# Altium schematic symbol library TI Amplifiers and Linear Operational Amplifier High Speed.SchLib: 1100 symbols (part 11 of 25) (continued)
## THS3001HVIDGN
designator U?
420 MHz Current-Feedback Amplifier, 9 to 32 V, -40 to 85 degC, 8-pin SOP (DGN8), Green (RoHS & no Sb/Br); Manufacturer: Texas Instruments; PartNumber: THS3001HVIDGN; 2nd Harmonic(dBc): 91; 3rd Harmonic(dBc): 86; @ MHz: 5; Acl, min stable gain(V/V): 1; BW @ Acl(MHz): 420; Diff Gain(%): 0.01; Diff Phase(deg): 0.02; Iib(Max)(nA): 15000; Io(Typ)(mA): 120; Iq per channel(Max)(mA): 10; Settling Time (0.1%)(Typ)(ns): 40; Slew Rate(Typ)(V/us): 6500; Sub Family: High Output Current Amplifier (>=50mA), High Speed Amplifier (>=50MHz), High Supply Voltage Amplifier (>=30V); THD (Fc is 1 MHz)(Typ)(dB): -96; Vio(Max)(mV): 3; Vn at Flatband(Typ)(nV/rtHz): 1.6; Vs(Max)(V): 32; Vs(Min)(V): 9; DatasheetVersion: SLOS217H; PackageVersion: 4073271/F, 05/2011; PackageReference: DGN8-1760X1425TP; PackageDescription: 8-pin Plastic Small Outline, Body 3 x 3 mm, Pitch 0.65 mm; Supplier 1: Digi-Key; Supplier Part Number 1: 296-19419-5-ND; Supplier 2: Newark; Supplier Part Number 2: 37K4174; Supplier 3: Mouser; Supplier Part Number 3: 595-THS3001HVIDGN; Eco-Plan: Green (RoHS & no Sb/Br); Number of Channels: 1; Mounting Technology: Surface Mount; Code_JEDEC: MO-187; ComponentLink1Description: Manufacturer URL; ComponentLink1URL: http://www.ti.com/; ComponentLink2Description: Datasheet; ComponentLink2URL: http://www.ti.com/general/docs/lit/getliterature.tsp?genericPartNumber=THS3001&fileType=pdf; ComponentLink3Description: Package Specification; ComponentLink3URL: http://www.ti.com/litv/pdf/mpds046e
footprint TI-DGN8-1760X1425TP_N (SOP, 8-Leads, Body 3x3mm, Pitch 0.65mm, Thermal Pad 1.76x1.425mm, IPC Medium Density)
footprint TI-DGN8-1760X1425TP_L (SOP, 8-Leads, Body 3x3mm, Pitch 0.65mm, Thermal Pad 1.76x1.425mm, IPC High Density)
footprint TI-DGN8-1760X1425TP_M (SOP, 8-Leads, Body 3x3mm, Pitch 0.65mm, Thermal Pad 1.76 x 1.425 mm, IPC Low Density)
part A pins: 2 IN- (in), 3 IN+ (in), 4 VCC- (power), 6 OUT (out), 7 VCC+ (power), 9 EP (power)
part B pins: 1 NC, 5 NC, 8 NC

## THS3001HVIDGNG4
designator U?
420 MHz Current-Feedback Amplifier, 9 to 32 V, -40 to 85 degC, 8-pin SOP (DGN8), Green (RoHS & no Sb/Br); Manufacturer: Texas Instruments; PartNumber: THS3001HVIDGNG4; 2nd Harmonic(dBc): 91; 3rd Harmonic(dBc): 86; @ MHz: 5; Acl, min stable gain(V/V): 1; BW @ Acl(MHz): 420; Diff Gain(%): 0.01; Diff Phase(deg): 0.02; Iib(Max)(nA): 15000; Io(Typ)(mA): 120; Iq per channel(Max)(mA): 10; Settling Time (0.1%)(Typ)(ns): 40; Slew Rate(Typ)(V/us): 6500; Sub Family: High Output Current Amplifier (>=50mA), High Speed Amplifier (>=50MHz), High Supply Voltage Amplifier (>=30V); THD (Fc is 1 MHz)(Typ)(dB): -96; Vio(Max)(mV): 3; Vn at Flatband(Typ)(nV/rtHz): 1.6; Vs(Max)(V): 32; Vs(Min)(V): 9; DatasheetVersion: SLOS217H; PackageVersion: 4073271/F, 05/2011; PackageReference: DGN8-1760X1425TP; PackageDescription: 8-pin Plastic Small Outline, Body 3 x 3 mm, Pitch 0.65 mm; Supplier 1: Digi-Key; Supplier Part Number 1: THS3001HVIDGNG4-ND; Supplier 2: Mouser; Supplier Part Number 2: 595-THS3001HVIDGNG4; Eco-Plan: Green (RoHS & no Sb/Br); Number of Channels: 1; Mounting Technology: Surface Mount; Code_JEDEC: MO-187; ComponentLink1Description: Manufacturer URL; ComponentLink1URL: http://www.ti.com/; ComponentLink2Description: Datasheet; ComponentLink2URL: http://www.ti.com/general/docs/lit/getliterature.tsp?genericPartNumber=THS3001&fileType=pdf; ComponentLink3Description: Package Specification; ComponentLink3URL: http://www.ti.com/litv/pdf/mpds046e
footprint TI-DGN8-1760X1425TP_N (SOP, 8-Leads, Body 3x3mm, Pitch 0.65mm, Thermal Pad 1.76x1.425mm, IPC Medium Density)
footprint TI-DGN8-1760X1425TP_L (SOP, 8-Leads, Body 3x3mm, Pitch 0.65mm, Thermal Pad 1.76x1.425mm, IPC High Density)
footprint TI-DGN8-1760X1425TP_M (SOP, 8-Leads, Body 3x3mm, Pitch 0.65mm, Thermal Pad 1.76 x 1.425 mm, IPC Low Density)
part A pins: 2 IN- (in), 3 IN+ (in), 4 VCC- (power), 6 OUT (out), 7 VCC+ (power), 9 EP (power)
part B pins: 1 NC, 5 NC, 8 NC

## THS3001ID
designator U?
420 MHz Current-Feedback Amplifier, 9 to 32 V, -40 to 85 degC, 8-pin SOIC (D8), Green (RoHS & no Sb/Br); Manufacturer: Texas Instruments; PartNumber: THS3001ID; 2nd Harmonic(dBc): 91; 3rd Harmonic(dBc): 86; @ MHz: 5; Acl, min stable gain(V/V): 1; BW @ Acl(MHz): 420; Diff Gain(%): 0.01; Diff Phase(deg): 0.02; Iib(Max)(nA): 15000; Io(Typ)(mA): 120; Iq per channel(Max)(mA): 10; Settling Time (0.1%)(Typ)(ns): 40; Slew Rate(Typ)(V/us): 6500; Sub Family: High Output Current Amplifier (>=50mA), High Speed Amplifier (>=50MHz), High Supply Voltage Amplifier (>=30V); THD (Fc is 1 MHz)(Typ)(dB): -96; Vio(Max)(mV): 3; Vn at Flatband(Typ)(nV/rtHz): 1.6; Vs(Max)(V): 32; Vs(Min)(V): 9; DatasheetVersion: SLOS217H; PackageVersion: 4040047-3/M, 06/2011; PackageReference: D8; PackageDescription: 8-Pin Plastic Small Outline, Body 4.9 x 3.9 mm, Pitch 1.27 mm; Supplier 1: Digi-Key; Supplier Part Number 1: 296-7507-5-ND; Supplier 2: Farnell; Supplier Part Number 2: 1102959; Supplier 3: Newark; Supplier Part Number 3: 24M8254; Supplier 4: Newark; Supplier Part Number 4: 49H4419; Supplier 5: Mouser; Supplier Part Number 5: 595-THS3001ID; Eco-Plan: Green (RoHS & no Sb/Br); Number of Channels: 1; Mounting Technology: Surface Mount; Code_JEDEC: MS-012; ComponentLink1Description: Manufacturer URL; ComponentLink1URL: http://www.ti.com/; ComponentLink2Description: Datasheet; ComponentLink2URL: http://www.ti.com/general/docs/lit/getliterature.tsp?genericPartNumber=THS3001&fileType=pdf; ComponentLink3Description: Package Specification; ComponentLink3URL: http://www.ti.com/litv/pdf/msoi002j
footprint TI-D8_N (SOIC, 8-Leads, Body 4.9x3.9mm, Pitch 1.27mm, IPC Medium Density)
footprint TI-D8_L (SOIC, 8-Leads, Body 4.9x3.9mm, Pitch 1.27mm, IPC High Density)
footprint TI-D8_M (SOIC, 8-Leads, Body 4.9x3.9mm, Pitch 1.27mm, IPC Low Density)
part A pins: 2 IN- (in), 3 IN+ (in), 4 VCC- (power), 6 OUT (out), 7 VCC+ (power)
part B pins: 1 NC, 5 NC, 8 NC

## THS3001IDG4
designator U?
420 MHz Current-Feedback Amplifier, 9 to 32 V, -40 to 85 degC, 8-pin SOIC (D8), Green (RoHS & no Sb/Br); Manufacturer: Texas Instruments; PartNumber: THS3001IDG4; 2nd Harmonic(dBc): 91; 3rd Harmonic(dBc): 86; @ MHz: 5; Acl, min stable gain(V/V): 1; BW @ Acl(MHz): 420; Diff Gain(%): 0.01; Diff Phase(deg): 0.02; Iib(Max)(nA): 15000; Io(Typ)(mA): 120; Iq per channel(Max)(mA): 10; Settling Time (0.1%)(Typ)(ns): 40; Slew Rate(Typ)(V/us): 6500; Sub Family: High Output Current Amplifier (>=50mA), High Speed Amplifier (>=50MHz), High Supply Voltage Amplifier (>=30V); THD (Fc is 1 MHz)(Typ)(dB): -96; Vio(Max)(mV): 3; Vn at Flatband(Typ)(nV/rtHz): 1.6; Vs(Max)(V): 32; Vs(Min)(V): 9; DatasheetVersion: SLOS217H; PackageVersion: 4040047-3/M, 06/2011; PackageReference: D8; PackageDescription: 8-Pin Plastic Small Outline, Body 4.9 x 3.9 mm, Pitch 1.27 mm; Supplier 1: Digi-Key; Supplier Part Number 1: THS3001IDG4-ND; Supplier 2: Newark; Supplier Part Number 2: 66K4316; Supplier 3: Mouser; Supplier Part Number 3: 595-THS3001IDG4; Eco-Plan: Green (RoHS & no Sb/Br); Number of Channels: 1; Mounting Technology: Surface Mount; Code_JEDEC: MS-012; ComponentLink1Description: Manufacturer URL; ComponentLink1URL: http://www.ti.com/; ComponentLink2Description: Datasheet; ComponentLink2URL: http://www.ti.com/general/docs/lit/getliterature.tsp?genericPartNumber=THS3001&fileType=pdf; ComponentLink3Description: Package Specification; ComponentLink3URL: http://www.ti.com/litv/pdf/msoi002j
footprint TI-D8_N (SOIC, 8-Leads, Body 4.9x3.9mm, Pitch 1.27mm, IPC Medium Density)
footprint TI-D8_L (SOIC, 8-Leads, Body 4.9x3.9mm, Pitch 1.27mm, IPC High Density)
footprint TI-D8_M (SOIC, 8-Leads, Body 4.9x3.9mm, Pitch 1.27mm, IPC Low Density)
part A pins: 2 IN- (in), 3 IN+ (in), 4 VCC- (power), 6 OUT (out), 7 VCC+ (power)
part B pins: 1 NC, 5 NC, 8 NC

## THS3001IDGN
designator U?
420 MHz Current-Feedback Amplifier, 9 to 32 V, -40 to 85 degC, 8-pin SOP (DGN8), Green (RoHS & no Sb/Br); Manufacturer: Texas Instruments; PartNumber: THS3001IDGN; 2nd Harmonic(dBc): 91; 3rd Harmonic(dBc): 86; @ MHz: 5; Acl, min stable gain(V/V): 1; BW @ Acl(MHz): 420; Diff Gain(%): 0.01; Diff Phase(deg): 0.02; Iib(Max)(nA): 15000; Io(Typ)(mA): 120; Iq per channel(Max)(mA): 10; Settling Time (0.1%)(Typ)(ns): 40; Slew Rate(Typ)(V/us): 6500; Sub Family: High Output Current Amplifier (>=50mA), High Speed Amplifier (>=50MHz), High Supply Voltage Amplifier (>=30V); THD (Fc is 1 MHz)(Typ)(dB): -96; Vio(Max)(mV): 3; Vn at Flatband(Typ)(nV/rtHz): 1.6; Vs(Max)(V): 32; Vs(Min)(V): 9; DatasheetVersion: SLOS217H; PackageVersion: 4073271/F, 05/2011; PackageReference: DGN8-1760X1425TP; PackageDescription: 8-pin Plastic Small Outline, Body 3 x 3 mm, Pitch 0.65 mm; Supplier 1: Digi-Key; Supplier Part Number 1: 296-34198-5-ND; Supplier 2: Newark; Supplier Part Number 2: 31C8413; Supplier 3: Mouser; Supplier Part Number 3: 595-THS3001IDGN; Eco-Plan: Green (RoHS & no Sb/Br); Number of Channels: 1; Mounting Technology: Surface Mount; Code_JEDEC: MO-187; ComponentLink1Description: Manufacturer URL; ComponentLink1URL: http://www.ti.com/; ComponentLink2Description: Datasheet; ComponentLink2URL: http://www.ti.com/general/docs/lit/getliterature.tsp?genericPartNumber=THS3001&fileType=pdf; ComponentLink3Description: Package Specification; ComponentLink3URL: http://www.ti.com/litv/pdf/mpds046e
footprint TI-DGN8-1760X1425TP_N (SOP, 8-Leads, Body 3x3mm, Pitch 0.65mm, Thermal Pad 1.76x1.425mm, IPC Medium Density)
footprint TI-DGN8-1760X1425TP_L (SOP, 8-Leads, Body 3x3mm, Pitch 0.65mm, Thermal Pad 1.76x1.425mm, IPC High Density)
footprint TI-DGN8-1760X1425TP_M (SOP, 8-Leads, Body 3x3mm, Pitch 0.65mm, Thermal Pad 1.76 x 1.425 mm, IPC Low Density)
part A pins: 2 IN- (in), 3 IN+ (in), 4 VCC- (power), 6 OUT (out), 7 VCC+ (power), 9 EP (power)
part B pins: 1 NC, 5 NC, 8 NC

## THS3001IDGNG4
designator U?
420 MHz Current-Feedback Amplifier, 9 to 32 V, -40 to 85 degC, 8-pin SOP (DGN8), Green (RoHS & no Sb/Br); Manufacturer: Texas Instruments; PartNumber: THS3001IDGNG4; 2nd Harmonic(dBc): 91; 3rd Harmonic(dBc): 86; @ MHz: 5; Acl, min stable gain(V/V): 1; BW @ Acl(MHz): 420; Diff Gain(%): 0.01; Diff Phase(deg): 0.02; Iib(Max)(nA): 15000; Io(Typ)(mA): 120; Iq per channel(Max)(mA): 10; Settling Time (0.1%)(Typ)(ns): 40; Slew Rate(Typ)(V/us): 6500; Sub Family: High Output Current Amplifier (>=50mA), High Speed Amplifier (>=50MHz), High Supply Voltage Amplifier (>=30V); THD (Fc is 1 MHz)(Typ)(dB): -96; Vio(Max)(mV): 3; Vn at Flatband(Typ)(nV/rtHz): 1.6; Vs(Max)(V): 32; Vs(Min)(V): 9; DatasheetVersion: SLOS217H; PackageVersion: 4073271/F, 05/2011; PackageReference: DGN8-1760X1425TP; PackageDescription: 8-pin Plastic Small Outline, Body 3 x 3 mm, Pitch 0.65 mm; Supplier 1: Digi-Key; Supplier Part Number 1: THS3001IDGNG4-ND; Supplier 2: Farnell; Supplier Part Number 2: 1234978; Supplier 3: Newark; Supplier Part Number 3: 13M3106; Supplier 4: Mouser; Supplier Part Number 4: 595-THS3001IDGNG4; Eco-Plan: Green (RoHS & no Sb/Br); Number of Channels: 1; Mounting Technology: Surface Mount; Code_JEDEC: MO-187; ComponentLink1Description: Manufacturer URL; ComponentLink1URL: http://www.ti.com/; ComponentLink2Description: Datasheet; ComponentLink2URL: http://www.ti.com/general/docs/lit/getliterature.tsp?genericPartNumber=THS3001&fileType=pdf; ComponentLink3Description: Package Specification; ComponentLink3URL: http://www.ti.com/litv/pdf/mpds046e
footprint TI-DGN8-1760X1425TP_N (SOP, 8-Leads, Body 3x3mm, Pitch 0.65mm, Thermal Pad 1.76x1.425mm, IPC Medium Density)
footprint TI-DGN8-1760X1425TP_L (SOP, 8-Leads, Body 3x3mm, Pitch 0.65mm, Thermal Pad 1.76x1.425mm, IPC High Density)
footprint TI-DGN8-1760X1425TP_M (SOP, 8-Leads, Body 3x3mm, Pitch 0.65mm, Thermal Pad 1.76 x 1.425 mm, IPC Low Density)
part A pins: 2 IN- (in), 3 IN+ (in), 4 VCC- (power), 6 OUT (out), 7 VCC+ (power), 9 EP (power)
part B pins: 1 NC, 5 NC, 8 NC

## THS3001IDGNR
designator U?
420 MHz Current-Feedback Amplifier, 9 to 32 V, -40 to 85 degC, 8-pin SOP (DGN8), Green (RoHS & no Sb/Br); Manufacturer: Texas Instruments; PartNumber: THS3001IDGNR; 2nd Harmonic(dBc): 91; 3rd Harmonic(dBc): 86; @ MHz: 5; Acl, min stable gain(V/V): 1; BW @ Acl(MHz): 420; Diff Gain(%): 0.01; Diff Phase(deg): 0.02; Iib(Max)(nA): 15000; Io(Typ)(mA): 120; Iq per channel(Max)(mA): 10; Settling Time (0.1%)(Typ)(ns): 40; Slew Rate(Typ)(V/us): 6500; Sub Family: High Output Current Amplifier (>=50mA), High Speed Amplifier (>=50MHz), High Supply Voltage Amplifier (>=30V); THD (Fc is 1 MHz)(Typ)(dB): -96; Vio(Max)(mV): 3; Vn at Flatband(Typ)(nV/rtHz): 1.6; Vs(Max)(V): 32; Vs(Min)(V): 9; DatasheetVersion: SLOS217H; PackageVersion: 4073271/F, 05/2011; PackageReference: DGN8-1760X1425TP; PackageDescription: 8-pin Plastic Small Outline, Body 3 x 3 mm, Pitch 0.65 mm; Supplier 1: Digi-Key; Supplier Part Number 1: 296-12006-2-ND; Supplier 2: Digi-Key; Supplier Part Number 2: 296-12006-1-ND; Supplier 3: Digi-Key; Supplier Part Number 3: 296-12006-6-ND; Supplier 4: Newark; Supplier Part Number 4: 76C6233; Supplier 5: Mouser; Supplier Part Number 5: 595-THS3001IDGNR; Eco-Plan: Green (RoHS & no Sb/Br); Number of Channels: 1; Mounting Technology: Surface Mount; Code_JEDEC: MO-187; ComponentLink1Description: Manufacturer URL; ComponentLink1URL: http://www.ti.com/; ComponentLink2Description: Datasheet; ComponentLink2URL: http://www.ti.com/general/docs/lit/getliterature.tsp?genericPartNumber=THS3001&fileType=pdf; ComponentLink3Description: Package Specification; ComponentLink3URL: http://www.ti.com/litv/pdf/mpds046e
footprint TI-DGN8-1760X1425TP_N (SOP, 8-Leads, Body 3x3mm, Pitch 0.65mm, Thermal Pad 1.76x1.425mm, IPC Medium Density)
footprint TI-DGN8-1760X1425TP_L (SOP, 8-Leads, Body 3x3mm, Pitch 0.65mm, Thermal Pad 1.76x1.425mm, IPC High Density)
footprint TI-DGN8-1760X1425TP_M (SOP, 8-Leads, Body 3x3mm, Pitch 0.65mm, Thermal Pad 1.76 x 1.425 mm, IPC Low Density)
part A pins: 2 IN- (in), 3 IN+ (in), 4 VCC- (power), 6 OUT (out), 7 VCC+ (power), 9 EP (power)
part B pins: 1 NC, 5 NC, 8 NC

## THS3001IDGNRG4
designator U?
420 MHz Current-Feedback Amplifier, 9 to 32 V, -40 to 85 degC, 8-pin SOP (DGN8), Green (RoHS & no Sb/Br); Manufacturer: Texas Instruments; PartNumber: THS3001IDGNRG4; 2nd Harmonic(dBc): 91; 3rd Harmonic(dBc): 86; @ MHz: 5; Acl, min stable gain(V/V): 1; BW @ Acl(MHz): 420; Diff Gain(%): 0.01; Diff Phase(deg): 0.02; Iib(Max)(nA): 15000; Io(Typ)(mA): 120; Iq per channel(Max)(mA): 10; Settling Time (0.1%)(Typ)(ns): 40; Slew Rate(Typ)(V/us): 6500; Sub Family: High Output Current Amplifier (>=50mA), High Speed Amplifier (>=50MHz), High Supply Voltage Amplifier (>=30V); THD (Fc is 1 MHz)(Typ)(dB): -96; Vio(Max)(mV): 3; Vn at Flatband(Typ)(nV/rtHz): 1.6; Vs(Max)(V): 32; Vs(Min)(V): 9; DatasheetVersion: SLOS217H; PackageVersion: 4073271/F, 05/2011; PackageReference: DGN8-1760X1425TP; PackageDescription: 8-pin Plastic Small Outline, Body 3 x 3 mm, Pitch 0.65 mm; Supplier 1: Digi-Key; Supplier Part Number 1: THS3001IDGNRG4-ND; Supplier 2: Newark; Supplier Part Number 2: 71J7923; Supplier 3: Mouser; Supplier Part Number 3: 595-THS3001IDGNRG4; Eco-Plan: Green (RoHS & no Sb/Br); Number of Channels: 1; Mounting Technology: Surface Mount; Code_JEDEC: MO-187; ComponentLink1Description: Manufacturer URL; ComponentLink1URL: http://www.ti.com/; ComponentLink2Description: Datasheet; ComponentLink2URL: http://www.ti.com/general/docs/lit/getliterature.tsp?genericPartNumber=THS3001&fileType=pdf; ComponentLink3Description: Package Specification; ComponentLink3URL: http://www.ti.com/litv/pdf/mpds046e
footprint TI-DGN8-1760X1425TP_N (SOP, 8-Leads, Body 3x3mm, Pitch 0.65mm, Thermal Pad 1.76x1.425mm, IPC Medium Density)
footprint TI-DGN8-1760X1425TP_L (SOP, 8-Leads, Body 3x3mm, Pitch 0.65mm, Thermal Pad 1.76x1.425mm, IPC High Density)
footprint TI-DGN8-1760X1425TP_M (SOP, 8-Leads, Body 3x3mm, Pitch 0.65mm, Thermal Pad 1.76 x 1.425 mm, IPC Low Density)
part A pins: 2 IN- (in), 3 IN+ (in), 4 VCC- (power), 6 OUT (out), 7 VCC+ (power), 9 EP (power)
part B pins: 1 NC, 5 NC, 8 NC

## THS3001IDR
designator U?
420 MHz Current-Feedback Amplifier, 9 to 32 V, -40 to 85 degC, 8-pin SOIC (D8), Green (RoHS & no Sb/Br); Manufacturer: Texas Instruments; PartNumber: THS3001IDR; 2nd Harmonic(dBc): 91; 3rd Harmonic(dBc): 86; @ MHz: 5; Acl, min stable gain(V/V): 1; BW @ Acl(MHz): 420; Diff Gain(%): 0.01; Diff Phase(deg): 0.02; Iib(Max)(nA): 15000; Io(Typ)(mA): 120; Iq per channel(Max)(mA): 10; Settling Time (0.1%)(Typ)(ns): 40; Slew Rate(Typ)(V/us): 6500; Sub Family: High Output Current Amplifier (>=50mA), High Speed Amplifier (>=50MHz), High Supply Voltage Amplifier (>=30V); THD (Fc is 1 MHz)(Typ)(dB): -96; Vio(Max)(mV): 3; Vn at Flatband(Typ)(nV/rtHz): 1.6; Vs(Max)(V): 32; Vs(Min)(V): 9; DatasheetVersion: SLOS217H; PackageVersion: 4040047-3/M, 06/2011; PackageReference: D8; PackageDescription: 8-Pin Plastic Small Outline, Body 4.9 x 3.9 mm, Pitch 1.27 mm; Supplier 1: Digi-Key; Supplier Part Number 1: THS3001IDR-ND; Supplier 2: Newark; Supplier Part Number 2: 76C6234; Supplier 3: Mouser; Supplier Part Number 3: 595-THS3001IDR; Eco-Plan: Green (RoHS & no Sb/Br); Number of Channels: 1; Mounting Technology: Surface Mount; Code_JEDEC: MS-012; ComponentLink1Description: Manufacturer URL; ComponentLink1URL: http://www.ti.com/; ComponentLink2Description: Datasheet; ComponentLink2URL: http://www.ti.com/general/docs/lit/getliterature.tsp?genericPartNumber=THS3001&fileType=pdf; ComponentLink3Description: Package Specification; ComponentLink3URL: http://www.ti.com/litv/pdf/msoi002j
footprint TI-D8_N (SOIC, 8-Leads, Body 4.9x3.9mm, Pitch 1.27mm, IPC Medium Density)
footprint TI-D8_L (SOIC, 8-Leads, Body 4.9x3.9mm, Pitch 1.27mm, IPC High Density)
footprint TI-D8_M (SOIC, 8-Leads, Body 4.9x3.9mm, Pitch 1.27mm, IPC Low Density)
part A pins: 2 IN- (in), 3 IN+ (in), 4 VCC- (power), 6 OUT (out), 7 VCC+ (power)
part B pins: 1 NC, 5 NC, 8 NC

## THS3001IDRG4
designator U?
420 MHz Current-Feedback Amplifier, 9 to 32 V, -40 to 85 degC, 8-pin SOIC (D8), Green (RoHS & no Sb/Br); Manufacturer: Texas Instruments; PartNumber: THS3001IDRG4; 2nd Harmonic(dBc): 91; 3rd Harmonic(dBc): 86; @ MHz: 5; Acl, min stable gain(V/V): 1; BW @ Acl(MHz): 420; Diff Gain(%): 0.01; Diff Phase(deg): 0.02; Iib(Max)(nA): 15000; Io(Typ)(mA): 120; Iq per channel(Max)(mA): 10; Settling Time (0.1%)(Typ)(ns): 40; Slew Rate(Typ)(V/us): 6500; Sub Family: High Output Current Amplifier (>=50mA), High Speed Amplifier (>=50MHz), High Supply Voltage Amplifier (>=30V); THD (Fc is 1 MHz)(Typ)(dB): -96; Vio(Max)(mV): 3; Vn at Flatband(Typ)(nV/rtHz): 1.6; Vs(Max)(V): 32; Vs(Min)(V): 9; DatasheetVersion: SLOS217H; PackageVersion: 4040047-3/M, 06/2011; PackageReference: D8; PackageDescription: 8-Pin Plastic Small Outline, Body 4.9 x 3.9 mm, Pitch 1.27 mm; Supplier 1: Digi-Key; Supplier Part Number 1: THS3001IDRG4-ND; Supplier 2: Mouser; Supplier Part Number 2: 595-THS3001IDRG4; Eco-Plan: Green (RoHS & no Sb/Br); Number of Channels: 1; Mounting Technology: Surface Mount; Code_JEDEC: MS-012; ComponentLink1Description: Manufacturer URL; ComponentLink1URL: http://www.ti.com/; ComponentLink2Description: Datasheet; ComponentLink2URL: http://www.ti.com/general/docs/lit/getliterature.tsp?genericPartNumber=THS3001&fileType=pdf; ComponentLink3Description: Package Specification; ComponentLink3URL: http://www.ti.com/litv/pdf/msoi002j
footprint TI-D8_N (SOIC, 8-Leads, Body 4.9x3.9mm, Pitch 1.27mm, IPC Medium Density)
footprint TI-D8_L (SOIC, 8-Leads, Body 4.9x3.9mm, Pitch 1.27mm, IPC High Density)
footprint TI-D8_M (SOIC, 8-Leads, Body 4.9x3.9mm, Pitch 1.27mm, IPC Low Density)
part A pins: 2 IN- (in), 3 IN+ (in), 4 VCC- (power), 6 OUT (out), 7 VCC+ (power)
part B pins: 1 NC, 5 NC, 8 NC

## THS3061D
designator U?
High-Voltage, High Slew-Rate Current Feedback Amplifier, 10 to 30 V, -40 to 85 degC, 8-pin SOIC (D8), Green (RoHS & no Sb/Br); Manufacturer: Texas Instruments; PartNumber: THS3061D; 2nd Harmonic(dBc): 78; 3rd Harmonic(dBc): 81; @ MHz: 10; Acl, min stable gain(V/V): 1; BW @ Acl(MHz): 300; Diff Gain(%): 0.02; Diff Phase(deg): 0.01; Iib(Max)(nA): 35000; Io(Typ)(mA): 145; Iq per channel(Max)(mA): 12; Settling Time (0.1%)(Typ)(ns): 30; Slew Rate(Typ)(V/us): 7000; Sub Family: High Output Current Amplifier (>=50mA), High Speed Amplifier (>=50MHz), High Supply Voltage Amplifier (>=30V); THD (Fc is 1 MHz)(Typ)(dB): -88; Vio(Max)(mV): 4.5; Vn at Flatband(Typ)(nV/rtHz): 2.6; DatasheetVersion: SLOS394B; PackageVersion: 4040047-3/M, 06/2011; PackageReference: D8; PackageDescription: 8-Pin Plastic Small Outline, Body 4.9 x 3.9 mm, Pitch 1.27 mm; Supplier 1: Digi-Key; Supplier Part Number 1: 296-13502-5-ND; Supplier 2: Farnell; Supplier Part Number 2: 8452962; Supplier 3: Newark; Supplier Part Number 3: 38K8224; Supplier 4: Newark; Supplier Part Number 4: 83C7603; Supplier 5: Mouser; Supplier Part Number 5: 595-THS3061D; Eco-Plan: Green (RoHS & no Sb/Br); Number of Channels: 1; Vs(Max)(V): 30; Vs(Min)(V): 10; Mounting Technology: Surface Mount; Code_JEDEC: MS-012; ComponentLink1Description: Manufacturer URL; ComponentLink1URL: http://www.ti.com/; ComponentLink2Description: Datasheet; ComponentLink2URL: http://www.ti.com/general/docs/lit/getliterature.tsp?genericPartNumber=THS3061&fileType=pdf; ComponentLink3Description: Package Specification; ComponentLink3URL: http://www.ti.com/litv/pdf/msoi002j
footprint TI-D8_N (SOIC, 8-Leads, Body 4.9x3.9mm, Pitch 1.27mm, IPC Medium Density)
footprint TI-D8_L (SOIC, 8-Leads, Body 4.9x3.9mm, Pitch 1.27mm, IPC High Density)
footprint TI-D8_M (SOIC, 8-Leads, Body 4.9x3.9mm, Pitch 1.27mm, IPC Low Density)
part A pins: 2 VIN- (in), 3 VIN+ (in), 4 VS- (power), 6 VOUT (out), 7 VS+ (power)
part B pins: 1 NC, 5 NC, 8 NC

## THS3061DG4
designator U?
High-Voltage, High Slew-Rate Current Feedback Amplifier, 10 to 30 V, -40 to 85 degC, 8-pin SOIC (D8), Green (RoHS & no Sb/Br); Manufacturer: Texas Instruments; PartNumber: THS3061DG4; 2nd Harmonic(dBc): 78; 3rd Harmonic(dBc): 81; @ MHz: 10; Acl, min stable gain(V/V): 1; BW @ Acl(MHz): 300; Diff Gain(%): 0.02; Diff Phase(deg): 0.01; Iib(Max)(nA): 35000; Io(Typ)(mA): 145; Iq per channel(Max)(mA): 12; Settling Time (0.1%)(Typ)(ns): 30; Slew Rate(Typ)(V/us): 7000; Sub Family: High Output Current Amplifier (>=50mA), High Speed Amplifier (>=50MHz), High Supply Voltage Amplifier (>=30V); THD (Fc is 1 MHz)(Typ)(dB): -88; Vio(Max)(mV): 4.5; Vn at Flatband(Typ)(nV/rtHz): 2.6; DatasheetVersion: SLOS394B; PackageVersion: 4040047-3/M, 06/2011; PackageReference: D8; PackageDescription: 8-Pin Plastic Small Outline, Body 4.9 x 3.9 mm, Pitch 1.27 mm; Supplier 1: Digi-Key; Supplier Part Number 1: THS3061DG4-ND; Supplier 2: Mouser; Supplier Part Number 2: 595-THS3061DG4; Eco-Plan: Green (RoHS & no Sb/Br); Number of Channels: 1; Vs(Max)(V): 30; Vs(Min)(V): 10; Mounting Technology: Surface Mount; Code_JEDEC: MS-012; ComponentLink1Description: Manufacturer URL; ComponentLink1URL: http://www.ti.com/; ComponentLink2Description: Datasheet; ComponentLink2URL: http://www.ti.com/general/docs/lit/getliterature.tsp?genericPartNumber=THS3061&fileType=pdf; ComponentLink3Description: Package Specification; ComponentLink3URL: http://www.ti.com/litv/pdf/msoi002j
footprint TI-D8_N (SOIC, 8-Leads, Body 4.9x3.9mm, Pitch 1.27mm, IPC Medium Density)
footprint TI-D8_L (SOIC, 8-Leads, Body 4.9x3.9mm, Pitch 1.27mm, IPC High Density)
footprint TI-D8_M (SOIC, 8-Leads, Body 4.9x3.9mm, Pitch 1.27mm, IPC Low Density)
part A pins: 2 VIN- (in), 3 VIN+ (in), 4 VS- (power), 6 VOUT (out), 7 VS+ (power)
part B pins: 1 NC, 5 NC, 8 NC

## THS3061DGN
designator U?
High-Voltage, High Slew-Rate Current Feedback Amplifier, 10 to 30 V, -40 to 85 degC, 8-pin SOP (DGN8), Green (RoHS & no Sb/Br); Manufacturer: Texas Instruments; PartNumber: THS3061DGN; 2nd Harmonic(dBc): 78; 3rd Harmonic(dBc): 81; @ MHz: 10; Acl, min stable gain(V/V): 1; BW @ Acl(MHz): 300; Diff Gain(%): 0.02; Diff Phase(deg): 0.01; Iib(Max)(nA): 35000; Io(Typ)(mA): 145; Iq per channel(Max)(mA): 12; Settling Time (0.1%)(Typ)(ns): 30; Slew Rate(Typ)(V/us): 7000; Sub Family: High Output Current Amplifier (>=50mA), High Speed Amplifier (>=50MHz), High Supply Voltage Amplifier (>=30V); THD (Fc is 1 MHz)(Typ)(dB): -88; Vio(Max)(mV): 4.5; Vn at Flatband(Typ)(nV/rtHz): 2.6; DatasheetVersion: SLOS394B; PackageVersion: 4073271/F, 05/2011; PackageReference: DGN8-1760X1425TP; PackageDescription: 8-pin Plastic Small Outline, Body 3 x 3 mm, Pitch 0.65 mm; Supplier 1: Digi-Key; Supplier Part Number 1: 296-13613-5-ND; Supplier 2: Newark; Supplier Part Number 2: 02E7104; Supplier 3: Mouser; Supplier Part Number 3: 595-THS3061DGN; Eco-Plan: Green (RoHS & no Sb/Br); Number of Channels: 1; Vs(Max)(V): 30; Vs(Min)(V): 10; Mounting Technology: Surface Mount; Code_JEDEC: MO-187; ComponentLink1Description: Manufacturer URL; ComponentLink1URL: http://www.ti.com/; ComponentLink2Description: Datasheet; ComponentLink2URL: http://www.ti.com/general/docs/lit/getliterature.tsp?genericPartNumber=THS3061&fileType=pdf; ComponentLink3Description: Package Specification; ComponentLink3URL: http://www.ti.com/litv/pdf/mpds046e
footprint TI-DGN8-1760X1425TP_N (SOP, 8-Leads, Body 3x3mm, Pitch 0.65mm, Thermal Pad 1.76x1.425mm, IPC Medium Density)
footprint TI-DGN8-1760X1425TP_L (SOP, 8-Leads, Body 3x3mm, Pitch 0.65mm, Thermal Pad 1.76x1.425mm, IPC High Density)
footprint TI-DGN8-1760X1425TP_M (SOP, 8-Leads, Body 3x3mm, Pitch 0.65mm, Thermal Pad 1.76 x 1.425 mm, IPC Low Density)
part A pins: 2 VIN- (in), 3 VIN+ (in), 4 VS- (power), 6 VOUT (out), 7 VS+ (power)
part B pins: 1 NC, 5 NC, 8 NC

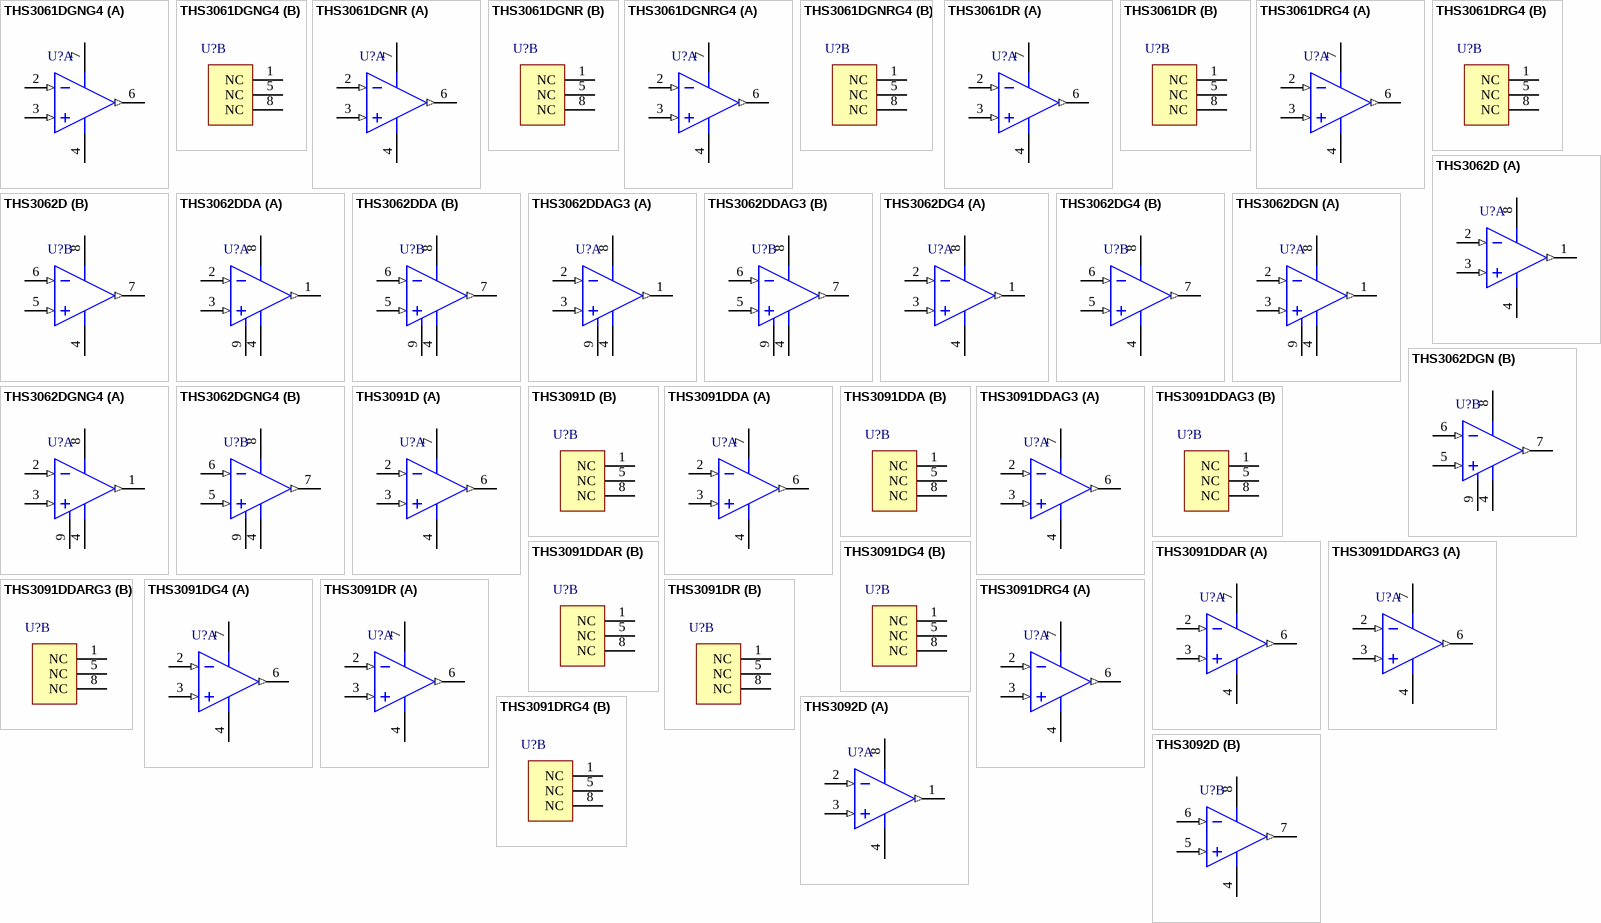
[diagram p24: symbols THS3061DGNG4 to THS3092D]

## THS3061DGNG4
designator U?
High-Voltage, High Slew-Rate Current Feedback Amplifier, 10 to 30 V, -40 to 85 degC, 8-pin SOP (DGN8), Green (RoHS & no Sb/Br); Manufacturer: Texas Instruments; PartNumber: THS3061DGNG4; 2nd Harmonic(dBc): 78; 3rd Harmonic(dBc): 81; @ MHz: 10; Acl, min stable gain(V/V): 1; BW @ Acl(MHz): 300; Diff Gain(%): 0.02; Diff Phase(deg): 0.01; Iib(Max)(nA): 35000; Io(Typ)(mA): 145; Iq per channel(Max)(mA): 12; Settling Time (0.1%)(Typ)(ns): 30; Slew Rate(Typ)(V/us): 7000; Sub Family: High Output Current Amplifier (>=50mA), High Speed Amplifier (>=50MHz), High Supply Voltage Amplifier (>=30V); THD (Fc is 1 MHz)(Typ)(dB): -88; Vio(Max)(mV): 4.5; Vn at Flatband(Typ)(nV/rtHz): 2.6; DatasheetVersion: SLOS394B; PackageVersion: 4073271/F, 05/2011; PackageReference: DGN8-1760X1425TP; PackageDescription: 8-pin Plastic Small Outline, Body 3 x 3 mm, Pitch 0.65 mm; Supplier 1: Digi-Key; Supplier Part Number 1: THS3061DGNG4-ND; Supplier 2: Mouser; Supplier Part Number 2: 595-THS3061DGNG4; Eco-Plan: Green (RoHS & no Sb/Br); Number of Channels: 1; Vs(Max)(V): 30; Vs(Min)(V): 10; Mounting Technology: Surface Mount; Code_JEDEC: MO-187; ComponentLink1Description: Manufacturer URL; ComponentLink1URL: http://www.ti.com/; ComponentLink2Description: Datasheet; ComponentLink2URL: http://www.ti.com/general/docs/lit/getliterature.tsp?genericPartNumber=THS3061&fileType=pdf; ComponentLink3Description: Package Specification; ComponentLink3URL: http://www.ti.com/litv/pdf/mpds046e
footprint TI-DGN8-1760X1425TP_N (SOP, 8-Leads, Body 3x3mm, Pitch 0.65mm, Thermal Pad 1.76x1.425mm, IPC Medium Density)
footprint TI-DGN8-1760X1425TP_L (SOP, 8-Leads, Body 3x3mm, Pitch 0.65mm, Thermal Pad 1.76x1.425mm, IPC High Density)
footprint TI-DGN8-1760X1425TP_M (SOP, 8-Leads, Body 3x3mm, Pitch 0.65mm, Thermal Pad 1.76 x 1.425 mm, IPC Low Density)
part A pins: 2 VIN- (in), 3 VIN+ (in), 4 VS- (power), 6 VOUT (out), 7 VS+ (power)
part B pins: 1 NC, 5 NC, 8 NC

## THS3061DGNR
designator U?
High-Voltage, High Slew-Rate Current Feedback Amplifier, 10 to 30 V, -40 to 85 degC, 8-pin SOP (DGN8), Green (RoHS & no Sb/Br); Manufacturer: Texas Instruments; PartNumber: THS3061DGNR; 2nd Harmonic(dBc): 78; 3rd Harmonic(dBc): 81; @ MHz: 10; Acl, min stable gain(V/V): 1; BW @ Acl(MHz): 300; Diff Gain(%): 0.02; Diff Phase(deg): 0.01; Iib(Max)(nA): 35000; Io(Typ)(mA): 145; Iq per channel(Max)(mA): 12; Settling Time (0.1%)(Typ)(ns): 30; Slew Rate(Typ)(V/us): 7000; Sub Family: High Output Current Amplifier (>=50mA), High Speed Amplifier (>=50MHz), High Supply Voltage Amplifier (>=30V); THD (Fc is 1 MHz)(Typ)(dB): -88; Vio(Max)(mV): 4.5; Vn at Flatband(Typ)(nV/rtHz): 2.6; DatasheetVersion: SLOS394B; PackageVersion: 4073271/F, 05/2011; PackageReference: DGN8-1760X1425TP; PackageDescription: 8-pin Plastic Small Outline, Body 3 x 3 mm, Pitch 0.65 mm; Supplier 1: Digi-Key; Supplier Part Number 1: THS3061DGNR-ND; Supplier 2: Newark; Supplier Part Number 2: 02E7105; Supplier 3: Mouser; Supplier Part Number 3: 595-THS3061DGNR; Eco-Plan: Green (RoHS & no Sb/Br); Number of Channels: 1; Vs(Max)(V): 30; Vs(Min)(V): 10; Mounting Technology: Surface Mount; Code_JEDEC: MO-187; ComponentLink1Description: Manufacturer URL; ComponentLink1URL: http://www.ti.com/; ComponentLink2Description: Datasheet; ComponentLink2URL: http://www.ti.com/general/docs/lit/getliterature.tsp?genericPartNumber=THS3061&fileType=pdf; ComponentLink3Description: Package Specification; ComponentLink3URL: http://www.ti.com/litv/pdf/mpds046e
footprint TI-DGN8-1760X1425TP_N (SOP, 8-Leads, Body 3x3mm, Pitch 0.65mm, Thermal Pad 1.76x1.425mm, IPC Medium Density)
footprint TI-DGN8-1760X1425TP_L (SOP, 8-Leads, Body 3x3mm, Pitch 0.65mm, Thermal Pad 1.76x1.425mm, IPC High Density)
footprint TI-DGN8-1760X1425TP_M (SOP, 8-Leads, Body 3x3mm, Pitch 0.65mm, Thermal Pad 1.76 x 1.425 mm, IPC Low Density)
part A pins: 2 VIN- (in), 3 VIN+ (in), 4 VS- (power), 6 VOUT (out), 7 VS+ (power)
part B pins: 1 NC, 5 NC, 8 NC

## THS3061DGNRG4
designator U?
High-Voltage, High Slew-Rate Current Feedback Amplifier, 10 to 30 V, -40 to 85 degC, 8-pin SOP (DGN8), Green (RoHS & no Sb/Br); Manufacturer: Texas Instruments; PartNumber: THS3061DGNRG4; 2nd Harmonic(dBc): 78; 3rd Harmonic(dBc): 81; @ MHz: 10; Acl, min stable gain(V/V): 1; BW @ Acl(MHz): 300; Diff Gain(%): 0.02; Diff Phase(deg): 0.01; Iib(Max)(nA): 35000; Io(Typ)(mA): 145; Iq per channel(Max)(mA): 12; Settling Time (0.1%)(Typ)(ns): 30; Slew Rate(Typ)(V/us): 7000; Sub Family: High Output Current Amplifier (>=50mA), High Speed Amplifier (>=50MHz), High Supply Voltage Amplifier (>=30V); THD (Fc is 1 MHz)(Typ)(dB): -88; Vio(Max)(mV): 4.5; Vn at Flatband(Typ)(nV/rtHz): 2.6; DatasheetVersion: SLOS394B; PackageVersion: 4073271/F, 05/2011; PackageReference: DGN8-1760X1425TP; PackageDescription: 8-pin Plastic Small Outline, Body 3 x 3 mm, Pitch 0.65 mm; Supplier 1: Digi-Key; Supplier Part Number 1: THS3061DGNRG4-ND; Supplier 2: Newark; Supplier Part Number 2: 24K4924; Supplier 3: Mouser; Supplier Part Number 3: 595-THS3061DGNRG4; Eco-Plan: Green (RoHS & no Sb/Br); Number of Channels: 1; Vs(Max)(V): 30; Vs(Min)(V): 10; Mounting Technology: Surface Mount; Code_JEDEC: MO-187; ComponentLink1Description: Manufacturer URL; ComponentLink1URL: http://www.ti.com/; ComponentLink2Description: Datasheet; ComponentLink2URL: http://www.ti.com/general/docs/lit/getliterature.tsp?genericPartNumber=THS3061&fileType=pdf; ComponentLink3Description: Package Specification; ComponentLink3URL: http://www.ti.com/litv/pdf/mpds046e
footprint TI-DGN8-1760X1425TP_N (SOP, 8-Leads, Body 3x3mm, Pitch 0.65mm, Thermal Pad 1.76x1.425mm, IPC Medium Density)
footprint TI-DGN8-1760X1425TP_L (SOP, 8-Leads, Body 3x3mm, Pitch 0.65mm, Thermal Pad 1.76x1.425mm, IPC High Density)
footprint TI-DGN8-1760X1425TP_M (SOP, 8-Leads, Body 3x3mm, Pitch 0.65mm, Thermal Pad 1.76 x 1.425 mm, IPC Low Density)
part A pins: 2 VIN- (in), 3 VIN+ (in), 4 VS- (power), 6 VOUT (out), 7 VS+ (power)
part B pins: 1 NC, 5 NC, 8 NC

## THS3061DR
designator U?
High-Voltage, High Slew-Rate Current Feedback Amplifier, 10 to 30 V, -40 to 85 degC, 8-pin SOIC (D8), Green (RoHS & no Sb/Br); Manufacturer: Texas Instruments; PartNumber: THS3061DR; 2nd Harmonic(dBc): 78; 3rd Harmonic(dBc): 81; @ MHz: 10; Acl, min stable gain(V/V): 1; BW @ Acl(MHz): 300; Diff Gain(%): 0.02; Diff Phase(deg): 0.01; Iib(Max)(nA): 35000; Io(Typ)(mA): 145; Iq per channel(Max)(mA): 12; Settling Time (0.1%)(Typ)(ns): 30; Slew Rate(Typ)(V/us): 7000; Sub Family: High Output Current Amplifier (>=50mA), High Speed Amplifier (>=50MHz), High Supply Voltage Amplifier (>=30V); THD (Fc is 1 MHz)(Typ)(dB): -88; Vio(Max)(mV): 4.5; Vn at Flatband(Typ)(nV/rtHz): 2.6; DatasheetVersion: SLOS394B; PackageVersion: 4040047-3/M, 06/2011; PackageReference: D8; PackageDescription: 8-Pin Plastic Small Outline, Body 4.9 x 3.9 mm, Pitch 1.27 mm; Supplier 1: Digi-Key; Supplier Part Number 1: THS3061DR-ND; Supplier 2: Newark; Supplier Part Number 2: 83C7604; Supplier 3: Mouser; Supplier Part Number 3: 595-THS3061DR; Eco-Plan: Green (RoHS & no Sb/Br); Number of Channels: 1; Vs(Max)(V): 30; Vs(Min)(V): 10; Mounting Technology: Surface Mount; Code_JEDEC: MS-012; ComponentLink1Description: Manufacturer URL; ComponentLink1URL: http://www.ti.com/; ComponentLink2Description: Datasheet; ComponentLink2URL: http://www.ti.com/general/docs/lit/getliterature.tsp?genericPartNumber=THS3061&fileType=pdf; ComponentLink3Description: Package Specification; ComponentLink3URL: http://www.ti.com/litv/pdf/msoi002j
footprint TI-D8_N (SOIC, 8-Leads, Body 4.9x3.9mm, Pitch 1.27mm, IPC Medium Density)
footprint TI-D8_L (SOIC, 8-Leads, Body 4.9x3.9mm, Pitch 1.27mm, IPC High Density)
footprint TI-D8_M (SOIC, 8-Leads, Body 4.9x3.9mm, Pitch 1.27mm, IPC Low Density)
part A pins: 2 VIN- (in), 3 VIN+ (in), 4 VS- (power), 6 VOUT (out), 7 VS+ (power)
part B pins: 1 NC, 5 NC, 8 NC

## THS3061DRG4
designator U?
High-Voltage, High Slew-Rate Current Feedback Amplifier, 10 to 30 V, -40 to 85 degC, 8-pin SOIC (D8), Green (RoHS & no Sb/Br); Manufacturer: Texas Instruments; PartNumber: THS3061DRG4; 2nd Harmonic(dBc): 78; 3rd Harmonic(dBc): 81; @ MHz: 10; Acl, min stable gain(V/V): 1; BW @ Acl(MHz): 300; Diff Gain(%): 0.02; Diff Phase(deg): 0.01; Iib(Max)(nA): 35000; Io(Typ)(mA): 145; Iq per channel(Max)(mA): 12; Settling Time (0.1%)(Typ)(ns): 30; Slew Rate(Typ)(V/us): 7000; Sub Family: High Output Current Amplifier (>=50mA), High Speed Amplifier (>=50MHz), High Supply Voltage Amplifier (>=30V); THD (Fc is 1 MHz)(Typ)(dB): -88; Vio(Max)(mV): 4.5; Vn at Flatband(Typ)(nV/rtHz): 2.6; DatasheetVersion: SLOS394B; PackageVersion: 4040047-3/M, 06/2011; PackageReference: D8; PackageDescription: 8-Pin Plastic Small Outline, Body 4.9 x 3.9 mm, Pitch 1.27 mm; Supplier 1: Digi-Key; Supplier Part Number 1: THS3061DRG4-ND; Supplier 2: Mouser; Supplier Part Number 2: 595-THS3061DRG4; Eco-Plan: Green (RoHS & no Sb/Br); Number of Channels: 1; Vs(Max)(V): 30; Vs(Min)(V): 10; Mounting Technology: Surface Mount; Code_JEDEC: MS-012; ComponentLink1Description: Manufacturer URL; ComponentLink1URL: http://www.ti.com/; ComponentLink2Description: Datasheet; ComponentLink2URL: http://www.ti.com/general/docs/lit/getliterature.tsp?genericPartNumber=THS3061&fileType=pdf; ComponentLink3Description: Package Specification; ComponentLink3URL: http://www.ti.com/litv/pdf/msoi002j
footprint TI-D8_N (SOIC, 8-Leads, Body 4.9x3.9mm, Pitch 1.27mm, IPC Medium Density)
footprint TI-D8_L (SOIC, 8-Leads, Body 4.9x3.9mm, Pitch 1.27mm, IPC High Density)
footprint TI-D8_M (SOIC, 8-Leads, Body 4.9x3.9mm, Pitch 1.27mm, IPC Low Density)
part A pins: 2 VIN- (in), 3 VIN+ (in), 4 VS- (power), 6 VOUT (out), 7 VS+ (power)
part B pins: 1 NC, 5 NC, 8 NC

## THS3062D
designator U?
High-Voltage, High Slew-Rate Current Feedback Amplifier, 10 to 30 V, -40 to 85 degC, 8-pin SOIC (D8), Green (RoHS & no Sb/Br); Manufacturer: Texas Instruments; PartNumber: THS3062D; 2nd Harmonic(dBc): 78; 3rd Harmonic(dBc): 81; @ MHz: 10; Acl, min stable gain(V/V): 1; BW @ Acl(MHz): 300; Diff Gain(%): 0.02; Diff Phase(deg): 0.01; Iib(Max)(nA): 35000; Io(Typ)(mA): 145; Iq per channel(Max)(mA): 12; Number of Channels: 2; Settling Time (0.1%)(Typ)(ns): 30; Slew Rate(Typ)(V/us): 7000; Sub Family: High Output Current Amplifier (>=50mA), High Speed Amplifier (>=50MHz), High Supply Voltage Amplifier (>=30V); THD (Fc is 1 MHz)(Typ)(dB): -88; Vio(Max)(mV): 4.5; Vn at Flatband(Typ)(nV/rtHz): 2.6; DatasheetVersion: SLOS394B; PackageVersion: 4040047-3/M, 06/2011; PackageReference: D8; PackageDescription: 8-Pin Plastic Small Outline, Body 4.9 x 3.9 mm, Pitch 1.27 mm; Supplier 1: Digi-Key; Supplier Part Number 1: 296-13821-5-ND; Supplier 2: Farnell; Supplier Part Number 2: 8452970; Supplier 3: Newark; Supplier Part Number 3: 38K8225; Supplier 4: Newark; Supplier Part Number 4: 02H5491; Supplier 5: Mouser; Supplier Part Number 5: 595-THS3062D; Eco-Plan: Green (RoHS & no Sb/Br); Vs(Max)(V): 30; Vs(Min)(V): 10; Mounting Technology: Surface Mount; Code_JEDEC: MS-012; ComponentLink1Description: Manufacturer URL; ComponentLink1URL: http://www.ti.com/; ComponentLink2Description: Datasheet; ComponentLink2URL: http://www.ti.com/general/docs/lit/getliterature.tsp?genericPartNumber=THS3062&fileType=pdf; ComponentLink3Description: Package Specification; ComponentLink3URL: http://www.ti.com/litv/pdf/msoi002j
footprint TI-D8_N (SOIC, 8-Leads, Body 4.9x3.9mm, Pitch 1.27mm, IPC Medium Density)
footprint TI-D8_L (SOIC, 8-Leads, Body 4.9x3.9mm, Pitch 1.27mm, IPC High Density)
footprint TI-D8_M (SOIC, 8-Leads, Body 4.9x3.9mm, Pitch 1.27mm, IPC Low Density)
pins on every part: 4 VS- (power), 8 VS+ (power)
part A pins: 1 VOUT1 (out), 2 VIN1- (in), 3 VIN1+ (in)
part B pins: 5 VIN2+ (in), 6 VIN2- (in), 7 VOUT2 (out)

## THS3062DDA
designator U?
High-Voltage, High Slew-Rate Current Feedback Amplifier, 10 to 30 V, -40 to 85 degC, 8-pin SOP (DDA8), Green (RoHS & no Sb/Br); Manufacturer: Texas Instruments; PartNumber: THS3062DDA; 2nd Harmonic(dBc): 78; 3rd Harmonic(dBc): 81; @ MHz: 10; Acl, min stable gain(V/V): 1; BW @ Acl(MHz): 300; Diff Gain(%): 0.02; Diff Phase(deg): 0.01; Iib(Max)(nA): 35000; Io(Typ)(mA): 145; Iq per channel(Max)(mA): 12; Number of Channels: 2; Settling Time (0.1%)(Typ)(ns): 30; Slew Rate(Typ)(V/us): 7000; Sub Family: High Output Current Amplifier (>=50mA), High Speed Amplifier (>=50MHz), High Supply Voltage Amplifier (>=30V); THD (Fc is 1 MHz)(Typ)(dB): -88; Vio(Max)(mV): 4.5; Vn at Flatband(Typ)(nV/rtHz): 2.6; DatasheetVersion: SLOS394B; PackageVersion: 4202561/F, 12/2011; PackageReference: DDA8-1775X1775TP; PackageDescription: 8-Pin PowerPAD(TM) Plastic Small Outline, Body 4.9 x 3.9 mm, Pitch 1.27 mm; Supplier 1: Digi-Key; Supplier Part Number 1: 296-13503-5-ND; Supplier 2: Newark; Supplier Part Number 2: 83C7605; Supplier 3: Mouser; Supplier Part Number 3: 595-THS3062DDA; Eco-Plan: Green (RoHS & no Sb/Br); Vs(Max)(V): 30; Vs(Min)(V): 10; Mounting Technology: Surface Mount; Code_JEDEC: MS-012; ComponentLink1Description: Manufacturer URL; ComponentLink1URL: http://www.ti.com/; ComponentLink2Description: Datasheet; ComponentLink2URL: http://www.ti.com/general/docs/lit/getliterature.tsp?genericPartNumber=THS3062&fileType=pdf; ComponentLink3Description: Package Specification; ComponentLink3URL: http://www.ti.com/litv/pdf/mpds092e
footprint TI-DDA8-1775X1775TP_N (SOP, 8-Leads, Body 4.9x3.9mm, Pitch 1.27mm, Thermal Pad 1.775x1.775mm, IPC Medium Density)
footprint TI-DDA8-1775X1775TP_L (SOP, 8-Leads, Body 4.9x3.9mm, Pitch 1.27mm, Thermal Pad 1.775x1.775mm, IPC High Density)
footprint TI-DDA8-1775X1775TP_M (SOP, 8-Leads, Body 4.9x3.9mm, Pitch 1.27mm, Thermal Pad 1.775x1.775mm, IPC Low Density)
pins on every part: 4 VS- (power), 8 VS+ (power), 9 EP
part A pins: 1 VOUT1 (out), 2 VIN1- (in), 3 VIN1+ (in)
part B pins: 5 VIN2+ (in), 6 VIN2- (in), 7 VOUT2 (out)

## THS3062DDAG3
designator U?
High-Voltage, High Slew-Rate Current Feedback Amplifier, 10 to 30 V, -40 to 85 degC, 8-pin SOP (DDA8), Green (RoHS & no Sb/Br); Manufacturer: Texas Instruments; PartNumber: THS3062DDAG3; 2nd Harmonic(dBc): 78; 3rd Harmonic(dBc): 81; @ MHz: 10; Acl, min stable gain(V/V): 1; BW @ Acl(MHz): 300; Diff Gain(%): 0.02; Diff Phase(deg): 0.01; Iib(Max)(nA): 35000; Io(Typ)(mA): 145; Iq per channel(Max)(mA): 12; Number of Channels: 2; Settling Time (0.1%)(Typ)(ns): 30; Slew Rate(Typ)(V/us): 7000; Sub Family: High Output Current Amplifier (>=50mA), High Speed Amplifier (>=50MHz), High Supply Voltage Amplifier (>=30V); THD (Fc is 1 MHz)(Typ)(dB): -88; Vio(Max)(mV): 4.5; Vn at Flatband(Typ)(nV/rtHz): 2.6; DatasheetVersion: SLOS394B; PackageVersion: 4202561/F, 12/2011; PackageReference: DDA8-1775X1775TP; PackageDescription: 8-Pin PowerPAD(TM) Plastic Small Outline, Body 4.9 x 3.9 mm, Pitch 1.27 mm; Supplier 1: Digi-Key; Supplier Part Number 1: THS3062DDAG3-ND; Supplier 2: Mouser; Supplier Part Number 2: 595-THS3062DDAG3; Eco-Plan: Green (RoHS & no Sb/Br); Vs(Max)(V): 30; Vs(Min)(V): 10; Mounting Technology: Surface Mount; Code_JEDEC: MS-012; ComponentLink1Description: Manufacturer URL; ComponentLink1URL: http://www.ti.com/; ComponentLink2Description: Datasheet; ComponentLink2URL: http://www.ti.com/general/docs/lit/getliterature.tsp?genericPartNumber=THS3062&fileType=pdf; ComponentLink3Description: Package Specification; ComponentLink3URL: http://www.ti.com/litv/pdf/mpds092e
footprint TI-DDA8-1775X1775TP_N (SOP, 8-Leads, Body 4.9x3.9mm, Pitch 1.27mm, Thermal Pad 1.775x1.775mm, IPC Medium Density)
footprint TI-DDA8-1775X1775TP_L (SOP, 8-Leads, Body 4.9x3.9mm, Pitch 1.27mm, Thermal Pad 1.775x1.775mm, IPC High Density)
footprint TI-DDA8-1775X1775TP_M (SOP, 8-Leads, Body 4.9x3.9mm, Pitch 1.27mm, Thermal Pad 1.775x1.775mm, IPC Low Density)
pins on every part: 4 VS- (power), 8 VS+ (power), 9 EP
part A pins: 1 VOUT1 (out), 2 VIN1- (in), 3 VIN1+ (in)
part B pins: 5 VIN2+ (in), 6 VIN2- (in), 7 VOUT2 (out)

## THS3062DG4
designator U?
High-Voltage, High Slew-Rate Current Feedback Amplifier, 10 to 30 V, -40 to 85 degC, 8-pin SOIC (D8), Green (RoHS & no Sb/Br); Manufacturer: Texas Instruments; PartNumber: THS3062DG4; 2nd Harmonic(dBc): 78; 3rd Harmonic(dBc): 81; @ MHz: 10; Acl, min stable gain(V/V): 1; BW @ Acl(MHz): 300; Diff Gain(%): 0.02; Diff Phase(deg): 0.01; Iib(Max)(nA): 35000; Io(Typ)(mA): 145; Iq per channel(Max)(mA): 12; Number of Channels: 2; Settling Time (0.1%)(Typ)(ns): 30; Slew Rate(Typ)(V/us): 7000; Sub Family: High Output Current Amplifier (>=50mA), High Speed Amplifier (>=50MHz), High Supply Voltage Amplifier (>=30V); THD (Fc is 1 MHz)(Typ)(dB): -88; Vio(Max)(mV): 4.5; Vn at Flatband(Typ)(nV/rtHz): 2.6; DatasheetVersion: SLOS394B; PackageVersion: 4040047-3/M, 06/2011; PackageReference: D8; PackageDescription: 8-Pin Plastic Small Outline, Body 4.9 x 3.9 mm, Pitch 1.27 mm; Supplier 1: Digi-Key; Supplier Part Number 1: THS3062DG4-ND; Supplier 2: Mouser; Supplier Part Number 2: 595-THS3062DG4; Eco-Plan: Green (RoHS & no Sb/Br); Vs(Max)(V): 30; Vs(Min)(V): 10; Mounting Technology: Surface Mount; Code_JEDEC: MS-012; ComponentLink1Description: Manufacturer URL; ComponentLink1URL: http://www.ti.com/; ComponentLink2Description: Datasheet; ComponentLink2URL: http://www.ti.com/general/docs/lit/getliterature.tsp?genericPartNumber=THS3062&fileType=pdf; ComponentLink3Description: Package Specification; ComponentLink3URL: http://www.ti.com/litv/pdf/msoi002j
footprint TI-D8_N (SOIC, 8-Leads, Body 4.9x3.9mm, Pitch 1.27mm, IPC Medium Density)
footprint TI-D8_L (SOIC, 8-Leads, Body 4.9x3.9mm, Pitch 1.27mm, IPC High Density)
footprint TI-D8_M (SOIC, 8-Leads, Body 4.9x3.9mm, Pitch 1.27mm, IPC Low Density)
pins on every part: 4 VS- (power), 8 VS+ (power)
part A pins: 1 VOUT1 (out), 2 VIN1- (in), 3 VIN1+ (in)
part B pins: 5 VIN2+ (in), 6 VIN2- (in), 7 VOUT2 (out)

## THS3062DGN
designator U?
High-Voltage, High Slew-Rate Current Feedback Amplifier, 10 to 30 V, -40 to 85 degC, 8-pin SOP (DGN8), Green (RoHS & no Sb/Br); Manufacturer: Texas Instruments; PartNumber: THS3062DGN; 2nd Harmonic(dBc): 78; 3rd Harmonic(dBc): 81; @ MHz: 10; Acl, min stable gain(V/V): 1; BW @ Acl(MHz): 300; Diff Gain(%): 0.02; Diff Phase(deg): 0.01; Iib(Max)(nA): 35000; Io(Typ)(mA): 145; Iq per channel(Max)(mA): 12; Number of Channels: 2; Settling Time (0.1%)(Typ)(ns): 30; Slew Rate(Typ)(V/us): 7000; Sub Family: High Output Current Amplifier (>=50mA), High Speed Amplifier (>=50MHz), High Supply Voltage Amplifier (>=30V); THD (Fc is 1 MHz)(Typ)(dB): -88; Vio(Max)(mV): 4.5; Vn at Flatband(Typ)(nV/rtHz): 2.6; DatasheetVersion: SLOS394B; PackageVersion: 4073271/F, 05/2011; PackageReference: DGN8-1760X1425TP; PackageDescription: 8-pin Plastic Small Outline, Body 3 x 3 mm, Pitch 0.65 mm; Supplier 1: Digi-Key; Supplier Part Number 1: 296-13614-5-ND; Supplier 2: Newark; Supplier Part Number 2: 02E7106; Supplier 3: Mouser; Supplier Part Number 3: 595-THS3062DGN; Eco-Plan: Green (RoHS & no Sb/Br); Vs(Max)(V): 30; Vs(Min)(V): 10; Mounting Technology: Surface Mount; Code_JEDEC: MO-187; ComponentLink1Description: Manufacturer URL; ComponentLink1URL: http://www.ti.com/; ComponentLink2Description: Datasheet; ComponentLink2URL: http://www.ti.com/general/docs/lit/getliterature.tsp?genericPartNumber=THS3062&fileType=pdf; ComponentLink3Description: Package Specification; ComponentLink3URL: http://www.ti.com/litv/pdf/mpds046e
footprint TI-DGN8-1760X1425TP_N (SOP, 8-Leads, Body 3x3mm, Pitch 0.65mm, Thermal Pad 1.76x1.425mm, IPC Medium Density)
footprint TI-DGN8-1760X1425TP_L (SOP, 8-Leads, Body 3x3mm, Pitch 0.65mm, Thermal Pad 1.76x1.425mm, IPC High Density)
footprint TI-DGN8-1760X1425TP_M (SOP, 8-Leads, Body 3x3mm, Pitch 0.65mm, Thermal Pad 1.76 x 1.425 mm, IPC Low Density)
pins on every part: 4 VS- (power), 8 VS+ (power), 9 EP
part A pins: 1 VOUT1 (out), 2 VIN1- (in), 3 VIN1+ (in)
part B pins: 5 VIN2+ (in), 6 VIN2- (in), 7 VOUT2 (out)